# Altium footprint library Connector.PcbLib: 231 footprints (part 3 of 15)
Each footprint in its own frame and in the unit in brackets; x right, y up, seen from the top. Pads: shape width x height; smd on the part's side, far side on the other; paste and mask are expansions set on the pad; w line width, h text height; cw(c..) or ccw(c..) is an arc to the next point about the centre after c.
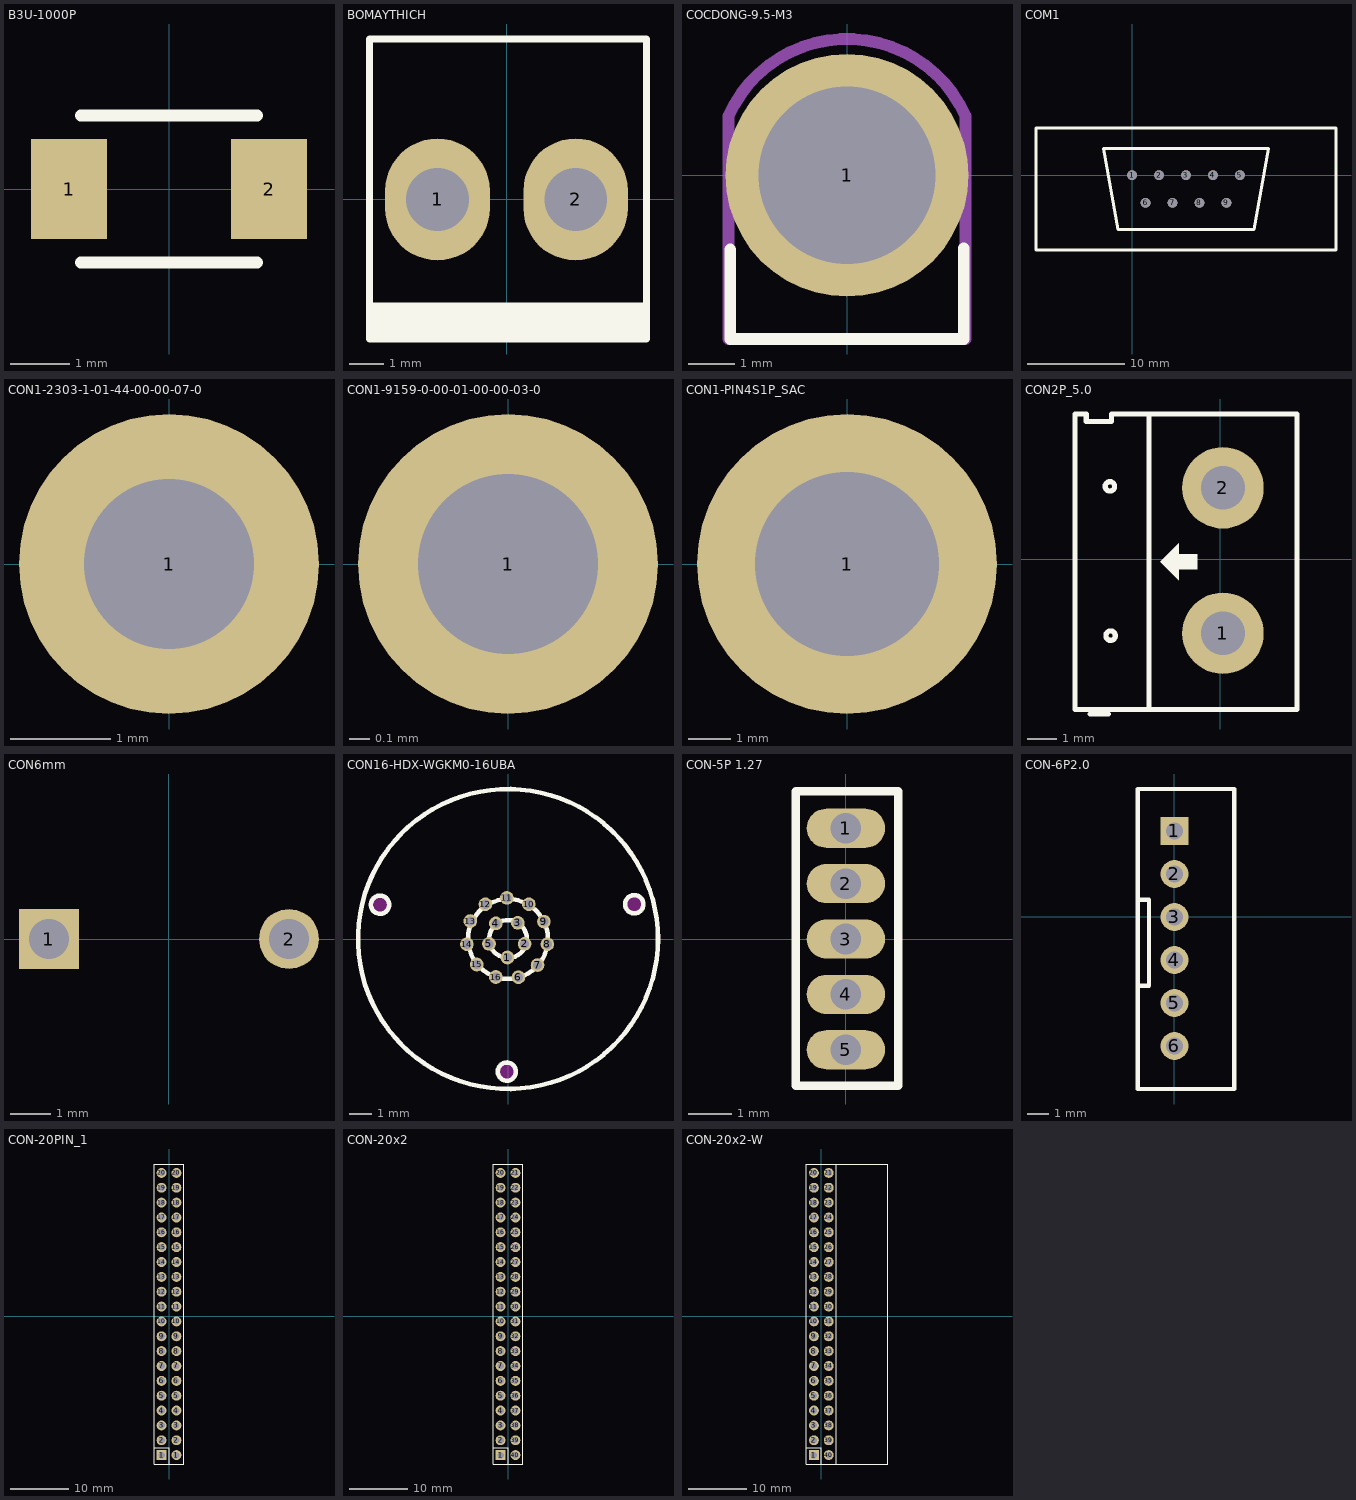
[diagram p2: the footprints below, top view; thin cyan lines are the x and y axes]

## B3U-1000P [mm] "OMRON"
height 1.75
pads (2):
  rect 1.3x1.7 smd: 1(-1.7,0) 2(1.7,0)
Top Overlay:
  lines w0.2: -1.5,-1.25 1.5,-1.25 ; -1.5,1.25 1.5,1.25
Mechanical 5:
  lines w0.1: -1.5,-0.7 -2,-0.7 -2,0.7 -1.5,0.7 ; 1.5,-0.7 2,-0.7 2,0.7 1.5,0.7
3D body "B3U_1000P[].step": height 1.6, standoff 0, extent -2,-1.25 2,1.25

## BOMAYTHICH [mm]
pads (2):
  oval 3x3.5 hole 1.8: 1(-1.98,0) 2(1.98,0)
Top Overlay:
  rectangle: -3.93,-4 4,-2.959
  lines w0.2: -3.93,-4 -3.93,4.6 4.011,4.6 4.011,-4 -3.93,-4
3D body "User Library-B2P-VH-BK.STEP": height 10.9, standoff -3.7, extent -3.9,-3.85 3.96,4.65

## CHOT_2P [mm]
3D body: height 7, standoff 0.3, extent -2.5,-1 2.5,1.5

## COCDONG-9.5-M3 [mm]
pads (1):
  round 5.2 hole 3.8: 1(0,0)
Top Overlay:
  lines w0.254: -2.5,-1.586 -2.5,-3.505 2.5,-3.505 2.5,-1.561
Mechanical 13:
  lines w0.254: -2.54,-3.505 2.54,-3.505 2.54,1.27 ccw(c0,0.142) -2.54,1.27 -2.54,-3.505
  text ".Designator" at 0.421,-3.618 h2
Mechanical 15:
  lines w0.254: -2.54,-3.505 -2.54,1.27 cw(c0,0.142) 2.54,1.27 2.54,-3.505 -2.54,-3.505
  text ".Comment" at 0.421,-3.618 h2
3D body "copper plug (1).stp": height 7.5, standoff -2, extent -2.5,-3.5 2.5,2.5

## COM1 [mm] "COM"
height 0.1
pads (9):
  round 1 hole 1: 1(0,0) 2(2.77,0) 3(5.54,0) 4(8.31,0) 5(11.08,0) 6(1.385,-2.84) 7(4.155,-2.84) 8(6.925,-2.84) 9(9.695,-2.84)
Top Overlay:
  lines w0.3: 6.925,-5.6 12.526,-5.6 14,2.76 11.08,2.76 8.31,2.76 2.76,2.76 -2.92,2.76 -1.446,-5.6 2.76,-5.6 8.31,-5.6 ; 9.695,4.855 20.945,4.855 20.945,0 20.945,-7.695 7.695,-7.695 ; 9.71,4.855 0,4.855 -9.865,4.855 -9.865,0 -9.865,-7.695 0,-7.695 ; 0,-7.695 7.695,-7.695 ; 0,-7.695 7.695,-7.695

## CON1-2303-1-01-44-00-00-07-0 [mm]
pads (1):
  round 3 hole 1.7: 1(0,0)
3D body: height 0, standoff -1.35, extent -0.756,-0.76 0.762,0.76
3D body: height 3.96, standoff 0, extent -1.184,-1.192 1.194,1.191

## CON1-9159-0-00-01-00-00-03-0 [mm]
pads (1):
  round 1.5 hole 0.9: 1(0,0)
3D body: height 0, standoff -1.14, extent -0.354,-0.355 0.354,0.355
3D body: height 0.25, standoff 0, extent -0.567,-0.57 0.572,0.57
3D body: height 4.22, standoff 0.25, extent -0.236,-0.228 0.22,0.228

## CON1-PIN4S1P_SAC [mm]
pads (1):
  round 7 hole 4.3: 1(0,0)
3D body: height 0, standoff -2.8, extent -2,-2 2,2
3D body: height 4.5, standoff 0, extent -3,-3 3,3
3D body: height 6.9, standoff 4.5, extent -2,-2 2,2

## CON2P_5.0 [mm]
pads (2):
  round 2.8 hole 1.5: 1(0.1,-2.55) 2(0.1,2.45)
Top Overlay:
  circle w0.178: c-3.761,-2.63 r0.163
  circle w0.178: c-3.786,2.501 r0.163
  region: -2.059,-0.09 -1.424,-0.725 -1.424,-0.344 -0.789,-0.344 -0.789,0.164 -1.424,0.164 -1.424,0.545
  lines w0.178: -4.599,4.736 -4.599,4.99 -4.98,4.99 -4.98,-5.17 -1.17,-5.17 2.64,-5.17 2.64,4.99 -3.735,4.99 -3.735,4.736 -4.523,4.736 ; -4.472,-5.322 -3.837,-5.322 ; -2.44,-5.17 -2.44,4.99 ; -0.916,4.99 2.107,4.99
3D body "Con 2 KF301.stp": height 8.52, standoff -3.48, extent -4.726,-3.773 2.574,3.847

## CON6mm [mm]
pads (2):
  rect 1.5x1.5 hole 1: 1(-3,0)
  round 1.5 hole 1: 2(3,0)

## CON16-HDX-WGKM0-16UBA [mm]
pads (16):
  round 0.6 hole 0.4: 1(-0.025,-0.813) 2(0.729,-0.212) 3(0.429,0.71) 4(-0.533,0.686) 5(-0.833,-0.212) 6(0.457,-1.676) 7(1.295,-1.143) 8(1.727,-0.229) 9(1.575,0.762) 10(0.914,1.524) 11(-0.051,1.803) 12(-0.991,1.524) 13(-1.651,0.787) 14(-1.803,-0.229) 15(-1.372,-1.118) 16(-0.533,-1.667)
Top Overlay:
  circle w0.2: c0,0 r6.579
  circle w0.2: c0,0 r0.83
  circle w0.2: c0,0 r1.75
  circle w0.2: c-0.051,-5.817 r0.4
  circle w0.2: c-5.613,1.503 r0.4
  circle w0.2: c5.537,1.524 r0.4
Keep-Out Layer:
  board cut-out: 5.137,1.524 5.137,1.444 5.198,1.297 5.311,1.185 5.458,1.124 5.537,1.124 5.617,1.124 5.764,1.185 5.876,1.297 5.937,1.444 5.937,1.524 5.937,1.604 5.876,1.751 5.764,1.863 5.617,1.924 5.537,1.924 5.458,1.924 5.311,1.863 5.198,1.751 5.137,1.604
  board cut-out: -0.451,-5.817 -0.451,-5.896 -0.39,-6.043 -0.277,-6.156 -0.13,-6.217 -0.051,-6.217 0.029,-6.217 0.176,-6.156 0.288,-6.043 0.349,-5.896 0.349,-5.817 0.349,-5.737 0.288,-5.59 0.176,-5.477 0.029,-5.417 -0.051,-5.417 -0.13,-5.417 -0.277,-5.477 -0.39,-5.59 -0.451,-5.737
  board cut-out: -6.013,1.503 -6.013,1.424 -5.953,1.277 -5.84,1.164 -5.693,1.103 -5.613,1.103 -5.534,1.103 -5.387,1.164 -5.274,1.277 -5.213,1.424 -5.213,1.503 -5.213,1.583 -5.274,1.73 -5.387,1.843 -5.534,1.903 -5.613,1.903 -5.693,1.903 -5.84,1.843 -5.953,1.73 -6.013,1.583
3D body "COCDONG.step": height 12.91, standoff -1.69, extent -6.641,-6.579 6.559,6.621

## CON-5P 1.27 [mm]
pads (5):
  oval 1.8x0.9 hole 0.7: 1(0,2.54) 2(0,1.27) 3(0,0) 4(0,-1.27) 5(0,-2.54)
Top Overlay:
  lines w0.2: -1.15,-3.364 -1.15,3.386 1.2,3.386 1.2,-3.364 -1.15,-3.364
3D body: height 4.3, standoff 0, extent -1.2,-3.35 1.2,3.386

## CON-6P2.0 [mm]
pads (6):
  rect 1.3x1.3 hole 0.8: 1(0,4)
  round 1.3 hole 0.8: 2(0,2) 3(0,0) 4(0,-2) 5(0,-4) 6(0,-6)
Top Overlay:
  lines w0.2: -1.712,-3.193 -1.187,-3.193 -1.187,0.807 -1.712,0.807 ; -1.712,-8 2.788,-8 2.788,5.95 -1.712,5.95 -1.712,-8
Mechanical 13:
  text ".Designator" at 1.063,2.46 h1.5
3D body "JST - XH - Thru (V) - 5Pin - 2.54mm.stp": height 7.21, standoff -3, extent -2.329,-8.446 3.513,6.388

## CON-20PIN_1 [mm]
pads (40):
  rect 1.7x1.7 hole 1.1: 1(-1.27,-23.733)
  round 1.7 hole 1.1: 1(1.27,-23.733) 2(-1.27,-21.193) 2(1.27,-21.193) 3(-1.27,-18.653) 3(1.27,-18.653) 4(-1.27,-16.113) 4(1.27,-16.113) 5(-1.27,-13.573) 5(1.27,-13.573) 6(-1.27,-11.033) 6(1.27,-11.033) 7(-1.27,-8.493) 7(1.27,-8.493) 8(-1.27,-5.953) 8(1.27,-5.953) 9(-1.27,-3.413) 9(1.27,-3.413) 10(-1.27,-0.873) 10(1.27,-0.873) 11(-1.27,1.667) 11(1.27,1.667) 12(-1.27,4.207) 12(1.27,4.207) 13(-1.27,6.747) 13(1.27,6.747) 14(-1.27,9.287) 14(1.27,9.287) 15(-1.27,11.827) 15(1.27,11.827) 16(-1.27,14.367) 16(1.27,14.367) 17(-1.27,16.907) 17(1.27,16.907) 18(-1.27,19.447) 18(1.27,19.447) 19(-1.27,21.987) 19(1.27,21.987) 20(-1.27,24.527) 20(1.27,24.527)
Top Overlay:
  lines w0.2: -2.54,-22.463 0,-22.463 0,-25.253 ; -2.54,-25.253 -2.54,26.047 2.54,26.047 2.54,-25.253 -2.54,-25.253
3D body "61304021821.stp": height 8.51, standoff -3.09, extent -2.54,-25.253 2.54,26.047

## CON-20x2 [mm]
pads (40):
  rect 1.7x1.7 hole 1.1: 1(-1.27,-23.733)
  round 1.7 hole 1.1: 2(-1.27,-21.193) 3(-1.27,-18.653) 4(-1.27,-16.113) 5(-1.27,-13.573) 6(-1.27,-11.033) 7(-1.27,-8.493) 8(-1.27,-5.953) 9(-1.27,-3.413) 10(-1.27,-0.873) 11(-1.27,1.667) 12(-1.27,4.207) 13(-1.27,6.747) 14(-1.27,9.287) 15(-1.27,11.827) 16(-1.27,14.367) 17(-1.27,16.907) 18(-1.27,19.447) 19(-1.27,21.987) 20(-1.27,24.527) 21(1.27,24.527) 22(1.27,21.987) 23(1.27,19.447) 24(1.27,16.907) 25(1.27,14.367) 26(1.27,11.827) 27(1.27,9.287) 28(1.27,6.747) 29(1.27,4.207) 30(1.27,1.667) 31(1.27,-0.873) 32(1.27,-3.413) 33(1.27,-5.953) 34(1.27,-8.493) 35(1.27,-11.033) 36(1.27,-13.573) 37(1.27,-16.113) 38(1.27,-18.653) 39(1.27,-21.193) 40(1.27,-23.733)
Top Overlay:
  lines w0.2: -2.54,-22.463 0,-22.463 0,-25.253 ; -2.54,-25.253 2.54,-25.253 2.54,26.047 -2.54,26.047 -2.54,-25.253
3D body "61304021821.stp": height 8.51, standoff -3.09, extent -2.54,-25.253 2.54,26.047

## CON-20x2-W [mm]
pads (40):
  rect 1.7x1.7 hole 1.1: 1(-1.27,-23.733)
  round 1.7 hole 1.1: 2(-1.27,-21.193) 3(-1.27,-18.653) 4(-1.27,-16.113) 5(-1.27,-13.573) 6(-1.27,-11.033) 7(-1.27,-8.493) 8(-1.27,-5.953) 9(-1.27,-3.413) 10(-1.27,-0.873) 11(-1.27,1.667) 12(-1.27,4.207) 13(-1.27,6.747) 14(-1.27,9.287) 15(-1.27,11.827) 16(-1.27,14.367) 17(-1.27,16.907) 18(-1.27,19.447) 19(-1.27,21.987) 20(-1.27,24.527) 21(1.27,24.527) 22(1.27,21.987) 23(1.27,19.447) 24(1.27,16.907) 25(1.27,14.367) 26(1.27,11.827) 27(1.27,9.287) 28(1.27,6.747) 29(1.27,4.207) 30(1.27,1.667) 31(1.27,-0.873) 32(1.27,-3.413) 33(1.27,-5.953) 34(1.27,-8.493) 35(1.27,-11.033) 36(1.27,-13.573) 37(1.27,-16.113) 38(1.27,-18.653) 39(1.27,-21.193) 40(1.27,-23.733)
Top Overlay:
  lines w0.2: -2.54,-22.463 0,-22.463 0,-25.253 ; 2.54,-25.253 -2.54,-25.253 -2.54,26.047 2.54,26.047 ; 2.54,-25.253 2.54,26.047 ; 2.54,-25.253 11.328,-25.253 11.328,-24.999 11.328,26.047 2.54,26.047
3D body "jump20x2cong.step": height 6.6, standoff -1.4, extent -1.572,-24.999 11.328,25.811